# Altium footprint library Package_QFP.PcbLib: 84 footprints (part 1 of 6) (continued)
## EQFP-144-1EP_20x20mm_P0.5mm_EP6.61x5.615mm_ThermalVias [mm] (continued)
  round 0.5 hole 0.2: 145(-2.6,-2.1) 145(-2.6,-0.7) 145(-2.6,0.7) 145(-2.6,2.1) 145(-1.3,-2.1) 145(-1.3,-0.7) 145(-1.3,0.7) 145(-1.3,2.1) 145(0,-2.1) 145(0,-0.7) 145(0,0.7) 145(0,2.1) 145(1.3,-2.1) 145(1.3,-0.7) 145(1.3,0.7) 145(1.3,2.1) 145(2.6,-2.1) 145(2.6,-0.7) 145(2.6,0.7) 145(2.6,2.1)
  rect 6.61x5.615 smd: 145(0,0)
  rect 5.7x4.7 smd far side: 145(0,0)
  rrect25% 0.568x1.129 on Top Paste: Un1(-2.953,1.4) Un10(2.953,1.4) Un13(2.953,0) Un18(-2.953,0) Un22(-2.953,-1.4) Un24(2.953,-1.4)
  rrect24% 1.048x1.129 on Top Paste: Un2(-0.65,0) Un3(-0.65,-1.4) Un5(1.95,-1.4) Un6(1.95,1.4) Un9(-0.65,1.4) Un11(0.65,0) Un14(-1.95,1.4) Un15(-1.95,0) Un16(1.95,0) Un17(0.65,-1.4) Un29(0.65,1.4) Un30(-1.95,-1.4)
  round 0.508 on Top Paste: Un4(-1.95,2.454) Un12(-0.65,2.454) Un19(-1.95,-2.454) Un20(1.95,-2.454) Un21(0.65,-2.454) Un23(0.65,2.454) Un25(1.95,2.454) Un26(-0.65,-2.454)
  round 0.465 on Top Paste: Un7(2.953,-2.454) Un8(-2.953,2.454) Un27(2.953,2.454) Un28(-2.953,-2.454)
F.SilkS:
  lines w0.12: -11.4,9.16 -10.11,9.16 -10.11,10.11 -9.16,10.11 ; -10.11,-9.16 -10.11,-10.11 -9.16,-10.11 ; 9.16,-10.11 10.11,-10.11 10.11,-9.16 ; 9.16,10.11 10.11,10.11 10.11,9.16
F.Paste:
  region: -2.772,-2.357 -2.772,-2.636 -3.133,-2.636 -3.133,-2.272 -2.857,-2.272
  region: 3.133,2.272 2.857,2.272 2.772,2.357 2.772,2.636 3.133,2.636
  region: -0.188,-2.283 -0.188,-2.676 -1.112,-2.676 -1.112,-2.283 -1.06,-2.231 -0.24,-2.231
  region: 2.412,2.283 2.36,2.231 1.54,2.231 1.488,2.283 1.488,2.676 2.412,2.676
  region: 1.112,2.283 1.06,2.231 0.24,2.231 0.188,2.283 0.188,2.676 1.112,2.676
  region: 1.112,-2.283 1.112,-2.676 0.188,-2.676 0.188,-2.283 0.24,-2.231 1.06,-2.231
  region: 2.412,-2.283 2.412,-2.676 1.488,-2.676 1.488,-2.283 1.54,-2.231 2.36,-2.231
  region: -1.488,-2.283 -1.488,-2.676 -2.412,-2.676 -2.412,-2.283 -2.36,-2.231 -1.54,-2.231
  region: -0.188,2.283 -0.24,2.231 -1.06,2.231 -1.112,2.283 -1.112,2.676 -0.188,2.676
  region: -2.772,2.357 -2.857,2.272 -3.133,2.272 -3.133,2.636 -2.772,2.636
  region: 3.133,-2.636 2.772,-2.636 2.772,-2.357 2.857,-2.272 3.133,-2.272
  region: -1.488,2.283 -1.54,2.231 -2.36,2.231 -2.412,2.283 -2.412,2.676 -1.488,2.676
F.CrtYd:
  lines w0.05: -11.65,-9.15 -11.65,0 -11.65,9.15 -10.25,9.15 -10.25,10.25 -9.15,10.25 -9.15,11.65 0,11.65 9.15,11.65 9.15,10.25 10.25,10.25 10.25,9.15 11.65,9.15 11.65,0 11.65,-9.15 10.25,-9.15 10.25,-10.25 9.15,-10.25 9.15,-11.65 0,-11.65 -9.15,-11.65 -9.15,-10.25 -10.25,-10.25 -10.25,-9.15 -11.65,-9.15
F.Fab:
  lines w0.1: -10,-10 10,-10 10,10 -9,10 -10,9 -10,-10
  text "'.Designator'" at -4.047,-0.84 h1
3D body "TQFP-144_20x20mm_P0.5mm.step": height 1.1, standoff 0, extent -11,-11 11,11

## EQFP-144-1EP_20x20mm_P0.5mm_EP7.2x6.35mm [mm]
pads (175):
  rrect25% 1.475x0.3 smd: 1(-10.663,8.75) 2(-10.663,8.25) 3(-10.663,7.75) 4(-10.663,7.25) 5(-10.663,6.75) 6(-10.663,6.25) 7(-10.663,5.75) 8(-10.663,5.25) 9(-10.663,4.75) 10(-10.663,4.25) 11(-10.663,3.75) 12(-10.663,3.25) 13(-10.663,2.75) 14(-10.663,2.25) 15(-10.663,1.75) 16(-10.663,1.25) 17(-10.663,0.75) 18(-10.663,0.25) 19(-10.663,-0.25) 20(-10.663,-0.75) 21(-10.663,-1.25) 22(-10.663,-1.75) 23(-10.663,-2.25) 24(-10.663,-2.75) 25(-10.663,-3.25) 26(-10.663,-3.75) 27(-10.663,-4.25) 28(-10.663,-4.75) 29(-10.663,-5.25) 30(-10.663,-5.75) 31(-10.663,-6.25) 32(-10.663,-6.75) 33(-10.663,-7.25) 34(-10.663,-7.75) 35(-10.663,-8.25) 36(-10.663,-8.75) 73(10.663,-8.75) 74(10.663,-8.25) 75(10.663,-7.75) 76(10.663,-7.25) 77(10.663,-6.75) 78(10.663,-6.25) 79(10.663,-5.75) 80(10.663,-5.25) 81(10.663,-4.75) 82(10.663,-4.25) 83(10.663,-3.75) 84(10.663,-3.25) 85(10.663,-2.75) 86(10.663,-2.25) 87(10.663,-1.75) 88(10.663,-1.25) 89(10.663,-0.75) 90(10.663,-0.25) 91(10.663,0.25) 92(10.663,0.75) 93(10.663,1.25) 94(10.663,1.75) 95(10.663,2.25) 96(10.663,2.75) 97(10.663,3.25) 98(10.663,3.75) 99(10.663,4.25) 100(10.663,4.75) 101(10.663,5.25) 102(10.663,5.75) 103(10.663,6.25) 104(10.663,6.75) 105(10.663,7.25) 106(10.663,7.75) 107(10.663,8.25) 108(10.663,8.75)
  rrect25% 0.3x1.475 smd: 37(-8.75,-10.663) 38(-8.25,-10.663) 39(-7.75,-10.663) 40(-7.25,-10.663) 41(-6.75,-10.663) 42(-6.25,-10.663) 43(-5.75,-10.663) 44(-5.25,-10.663) 45(-4.75,-10.663) 46(-4.25,-10.663) 47(-3.75,-10.663) 48(-3.25,-10.663) 49(-2.75,-10.663) 50(-2.25,-10.663) 51(-1.75,-10.663) 52(-1.25,-10.663) 53(-0.75,-10.663) 54(-0.25,-10.663) 55(0.25,-10.663) 56(0.75,-10.663) 57(1.25,-10.663) 58(1.75,-10.663) 59(2.25,-10.663) 60(2.75,-10.663) 61(3.25,-10.663) 62(3.75,-10.663) 63(4.25,-10.663) 64(4.75,-10.663) 65(5.25,-10.663) 66(5.75,-10.663) 67(6.25,-10.663) 68(6.75,-10.663) 69(7.25,-10.663) 70(7.75,-10.663) 71(8.25,-10.663) 72(8.75,-10.663) 109(8.75,10.663) 110(8.25,10.663) 111(7.75,10.663) 112(7.25,10.663) 113(6.75,10.663) 114(6.25,10.663) 115(5.75,10.663) 116(5.25,10.663) 117(4.75,10.663) 118(4.25,10.663) 119(3.75,10.663) 120(3.25,10.663) 121(2.75,10.663) 122(2.25,10.663) 123(1.75,10.663) 124(1.25,10.663) 125(0.75,10.663) 126(0.25,10.663) 127(-0.25,10.663) 128(-0.75,10.663) 129(-1.25,10.663) 130(-1.75,10.663) 131(-2.25,10.663) 132(-2.75,10.663) 133(-3.25,10.663) 134(-3.75,10.663) 135(-4.25,10.663) 136(-4.75,10.663) 137(-5.25,10.663) 138(-5.75,10.663) 139(-6.25,10.663) 140(-6.75,10.663) 141(-7.25,10.663) 142(-7.75,10.663) 143(-8.25,10.663) 144(-8.75,10.663)
  rect 7.2x6.35 smd: 145(0,0)
  rrect25% 0.97x1.02 on Top Paste: Un1(-3,0) Un2(3,1.27) Un3(3,-1.27) Un4(1.8,-2.54) Un5(1.8,0) Un6(-0.6,2.54) Un7(3,-2.54) Un8(-1.8,2.54) Un9(0.6,-2.54) Un10(1.8,-1.27) Un11(-0.6,0) Un12(3,2.54) Un13(-0.6,1.27) Un14(-1.8,1.27) Un15(0.6,-1.27) Un16(-0.6,-1.27) Un17(-0.6,-2.54) Un18(3,0) Un19(-3,-1.27) Un20(0.6,1.27) Un21(-1.8,-1.27) Un22(0.6,0) Un23(0.6,2.54) Un24(-1.8,0) Un25(-1.8,-2.54) Un26(-3,-2.54) Un27(-3,1.27) Un28(1.8,2.54) Un29(-3,2.54) Un30(1.8,1.27)
F.SilkS:
  lines w0.12: -11.4,9.16 -10.11,9.16 -10.11,10.11 -9.16,10.11 ; -10.11,-9.16 -10.11,-10.11 -9.16,-10.11 ; 9.16,-10.11 10.11,-10.11 10.11,-9.16 ; 9.16,10.11 10.11,10.11 10.11,9.16
F.CrtYd:
  lines w0.05: -11.65,-9.15 -11.65,0 -11.65,9.15 -10.25,9.15 -10.25,10.25 -9.15,10.25 -9.15,11.65 0,11.65 9.15,11.65 9.15,10.25 10.25,10.25 10.25,9.15 11.65,9.15 11.65,0 11.65,-9.15 10.25,-9.15 10.25,-10.25 9.15,-10.25 9.15,-11.65 0,-11.65 -9.15,-11.65 -9.15,-10.25 -10.25,-10.25 -10.25,-9.15 -11.65,-9.15
F.Fab:
  lines w0.1: -10,-10 -10,9 -9,10 10,10 10,-10 -10,-10
  text "'.Designator'" at -4.047,-0.84 h1
3D body "TQFP-144_20x20mm_P0.5mm.step": height 1.1, standoff 0, extent -11,-11 11,11

## EQFP-144-1EP_20x20mm_P0.5mm_EP7.2x6.35mm_ThermalVias [mm]
pads (218):
  rrect25% 1.475x0.3 smd: 1(-10.663,8.75) 2(-10.663,8.25) 3(-10.663,7.75) 4(-10.663,7.25) 5(-10.663,6.75) 6(-10.663,6.25) 7(-10.663,5.75) 8(-10.663,5.25) 9(-10.663,4.75) 10(-10.663,4.25) 11(-10.663,3.75) 12(-10.663,3.25) 13(-10.663,2.75) 14(-10.663,2.25) 15(-10.663,1.75) 16(-10.663,1.25) 17(-10.663,0.75) 18(-10.663,0.25) 19(-10.663,-0.25) 20(-10.663,-0.75) 21(-10.663,-1.25) 22(-10.663,-1.75) 23(-10.663,-2.25) 24(-10.663,-2.75) 25(-10.663,-3.25) 26(-10.663,-3.75) 27(-10.663,-4.25) 28(-10.663,-4.75) 29(-10.663,-5.25) 30(-10.663,-5.75) 31(-10.663,-6.25) 32(-10.663,-6.75) 33(-10.663,-7.25) 34(-10.663,-7.75) 35(-10.663,-8.25) 36(-10.663,-8.75) 73(10.663,-8.75) 74(10.663,-8.25) 75(10.663,-7.75) 76(10.663,-7.25) 77(10.663,-6.75) 78(10.663,-6.25) 79(10.663,-5.75) 80(10.663,-5.25) 81(10.663,-4.75) 82(10.663,-4.25) 83(10.663,-3.75) 84(10.663,-3.25) 85(10.663,-2.75) 86(10.663,-2.25) 87(10.663,-1.75) 88(10.663,-1.25) 89(10.663,-0.75) 90(10.663,-0.25) 91(10.663,0.25) 92(10.663,0.75) 93(10.663,1.25) 94(10.663,1.75) 95(10.663,2.25) 96(10.663,2.75) 97(10.663,3.25) 98(10.663,3.75) 99(10.663,4.25) 100(10.663,4.75) 101(10.663,5.25) 102(10.663,5.75) 103(10.663,6.25) 104(10.663,6.75) 105(10.663,7.25) 106(10.663,7.75) 107(10.663,8.25) 108(10.663,8.75)
  rrect25% 0.3x1.475 smd: 37(-8.75,-10.663) 38(-8.25,-10.663) 39(-7.75,-10.663) 40(-7.25,-10.663) 41(-6.75,-10.663) 42(-6.25,-10.663) 43(-5.75,-10.663) 44(-5.25,-10.663) 45(-4.75,-10.663) 46(-4.25,-10.663) 47(-3.75,-10.663) 48(-3.25,-10.663) 49(-2.75,-10.663) 50(-2.25,-10.663) 51(-1.75,-10.663) 52(-1.25,-10.663) 53(-0.75,-10.663) 54(-0.25,-10.663) 55(0.25,-10.663) 56(0.75,-10.663) 57(1.25,-10.663) 58(1.75,-10.663) 59(2.25,-10.663) 60(2.75,-10.663) 61(3.25,-10.663) 62(3.75,-10.663) 63(4.25,-10.663) 64(4.75,-10.663) 65(5.25,-10.663) 66(5.75,-10.663) 67(6.25,-10.663) 68(6.75,-10.663) 69(7.25,-10.663) 70(7.75,-10.663) 71(8.25,-10.663) 72(8.75,-10.663) 109(8.75,10.663) 110(8.25,10.663) 111(7.75,10.663) 112(7.25,10.663) 113(6.75,10.663) 114(6.25,10.663) 115(5.75,10.663) 116(5.25,10.663) 117(4.75,10.663) 118(4.25,10.663) 119(3.75,10.663) 120(3.25,10.663) 121(2.75,10.663) 122(2.25,10.663) 123(1.75,10.663) 124(1.25,10.663) 125(0.75,10.663) 126(0.25,10.663) 127(-0.25,10.663) 128(-0.75,10.663) 129(-1.25,10.663) 130(-1.75,10.663) 131(-2.25,10.663) 132(-2.75,10.663) 133(-3.25,10.663) 134(-3.75,10.663) 135(-4.25,10.663) 136(-4.75,10.663) 137(-5.25,10.663) 138(-5.75,10.663) 139(-6.25,10.663) 140(-6.75,10.663) 141(-7.25,10.663) 142(-7.75,10.663) 143(-8.25,10.663) 144(-8.75,10.663)
  round 0.5 hole 0.2: 145(-3,-2.4) 145(-3,-1.2) 145(-3,0) 145(-3,1.2) 145(-3,2.4) 145(-1.8,-2.4) 145(-1.8,-1.2) 145(-1.8,0) 145(-1.8,1.2) 145(-1.8,2.4) 145(-0.6,-2.4) 145(-0.6,-1.2) 145(-0.6,0) 145(-0.6,1.2) 145(-0.6,2.4) 145(0.6,-2.4) 145(0.6,-1.2) 145(0.6,0) 145(0.6,1.2) 145(0.6,2.4) 145(1.8,-2.4) 145(1.8,-1.2) 145(1.8,0) 145(1.8,1.2) 145(1.8,2.4) 145(3,-2.4) 145(3,-1.2) 145(3,0) 145(3,1.2) 145(3,2.4)
  rect 7.2x6.35 smd: 145(0,0)
  rect 6.5x5.3 smd far side: 145(0,0)
  rrect25% 0.967x0.625 on Top Paste: Un1(-2.4,2.788) Un4(2.4,2.788) Un10(-2.4,-2.788) Un14(2.4,-2.788) Un16(0,2.788) Un18(-1.2,-2.788) Un20(1.2,-2.788) Un28(0,-2.788) Un39(1.2,2.788) Un40(-1.2,2.788)
  round 0.378 on Top Paste: Un2(-3.3,-2.788) Un23(-3.3,2.788) Un24(3.3,-2.788) Un41(3.3,2.788)
  rrect25% 0.967x0.967 on Top Paste: Un3(-2.4,1.8) Un5(-1.2,0.6) Un6(2.4,0.6) Un7(1.2,-0.6) Un8(-1.2,-0.6) Un11(2.4,-1.8) Un12(-1.2,-1.8) Un15(-2.4,-0.6) Un17(2.4,-0.6) Un21(0,-1.8) Un25(1.2,0.6) Un26(1.2,-1.8) Un27(-1.2,1.8) Un30(1.2,1.8) Un31(-2.4,-1.8) Un32(0,1.8) Un33(0,-0.6) Un35(0,0.6) Un36(2.4,1.8) Un42(-2.4,0.6)
  round 0.407 on Top Paste: Un9(-3.3,-0.6) Un13(-3.3,0.6) Un19(-3.3,1.8) Un22(3.3,1.8) Un29(3.3,0.6) Un34(3.3,-0.6) Un37(-3.3,-1.8) Un38(3.3,-1.8)
F.SilkS:
  lines w0.12: -11.4,9.16 -10.11,9.16 -10.11,10.11 -9.16,10.11 ; -10.11,-9.16 -10.11,-10.11 -9.16,-10.11 ; 9.16,-10.11 10.11,-10.11 10.11,-9.16 ; 9.16,10.11 10.11,10.11 10.11,9.16
F.Paste:
  region: -3.164,-2.669 -3.164,-2.994 -3.436,-2.994 -3.436,-2.581 -3.252,-2.581
  region: -3.135,-0.256 -3.135,-0.944 -3.198,-1.007 -3.465,-1.007 -3.465,-0.193 -3.198,-0.193
  region: -3.135,0.944 -3.135,0.256 -3.198,0.193 -3.465,0.193 -3.465,1.007 -3.198,1.007
  region: -3.135,2.144 -3.135,1.456 -3.198,1.393 -3.465,1.393 -3.465,2.207 -3.198,2.207
  region: 3.465,1.393 3.198,1.393 3.135,1.456 3.135,2.144 3.198,2.207 3.465,2.207
  region: -3.164,2.669 -3.252,2.581 -3.436,2.581 -3.436,2.994 -3.164,2.994
  region: 3.436,-2.994 3.164,-2.994 3.164,-2.669 3.252,-2.581 3.436,-2.581
  region: 3.465,0.193 3.198,0.193 3.135,0.256 3.135,0.944 3.198,1.007 3.465,1.007
  region: 3.465,-1.007 3.198,-1.007 3.135,-0.944 3.135,-0.256 3.198,-0.193 3.465,-0.193
  region: -3.135,-1.456 -3.135,-2.144 -3.198,-2.207 -3.465,-2.207 -3.465,-1.393 -3.198,-1.393
  region: 3.465,-2.207 3.198,-2.207 3.135,-2.144 3.135,-1.456 3.198,-1.393 3.465,-1.393
  region: 3.436,2.581 3.252,2.581 3.164,2.669 3.164,2.994 3.436,2.994
F.CrtYd:
  lines w0.05: -11.65,-9.15 -10.25,-9.15 -10.25,-10.25 -9.15,-10.25 -9.15,-11.65 0,-11.65 9.15,-11.65 9.15,-10.25 10.25,-10.25 10.25,-9.15 11.65,-9.15 11.65,0 11.65,9.15 10.25,9.15 10.25,10.25 9.15,10.25 9.15,11.65 0,11.65 -9.15,11.65 -9.15,10.25 -10.25,10.25 -10.25,9.15 -11.65,9.15 -11.65,0 -11.65,-9.15
F.Fab:
  lines w0.1: -10,-10 -10,9 -9,10 10,10 10,-10 -10,-10
  text "'.Designator'" at -4.047,-0.84 h1
3D body "TQFP-144_20x20mm_P0.5mm.step": height 1.1, standoff 0, extent -11,-11 11,11

## EQFP-144-1EP_20x20mm_P0.5mm_EP8.93x8.7mm [mm]
pads (194):
  rrect25% 1.475x0.3 smd: 1(-10.663,8.75) 2(-10.663,8.25) 3(-10.663,7.75) 4(-10.663,7.25) 5(-10.663,6.75) 6(-10.663,6.25) 7(-10.663,5.75) 8(-10.663,5.25) 9(-10.663,4.75) 10(-10.663,4.25) 11(-10.663,3.75) 12(-10.663,3.25) 13(-10.663,2.75) 14(-10.663,2.25) 15(-10.663,1.75) 16(-10.663,1.25) 17(-10.663,0.75) 18(-10.663,0.25) 19(-10.663,-0.25) 20(-10.663,-0.75) 21(-10.663,-1.25) 22(-10.663,-1.75) 23(-10.663,-2.25) 24(-10.663,-2.75) 25(-10.663,-3.25) 26(-10.663,-3.75) 27(-10.663,-4.25) 28(-10.663,-4.75) 29(-10.663,-5.25) 30(-10.663,-5.75) 31(-10.663,-6.25) 32(-10.663,-6.75) 33(-10.663,-7.25) 34(-10.663,-7.75) 35(-10.663,-8.25) 36(-10.663,-8.75) 73(10.663,-8.75) 74(10.663,-8.25) 75(10.663,-7.75) 76(10.663,-7.25) 77(10.663,-6.75) 78(10.663,-6.25) 79(10.663,-5.75) 80(10.663,-5.25) 81(10.663,-4.75) 82(10.663,-4.25) 83(10.663,-3.75) 84(10.663,-3.25) 85(10.663,-2.75) 86(10.663,-2.25) 87(10.663,-1.75) 88(10.663,-1.25) 89(10.663,-0.75) 90(10.663,-0.25) 91(10.663,0.25) 92(10.663,0.75) 93(10.663,1.25) 94(10.663,1.75) 95(10.663,2.25) 96(10.663,2.75) 97(10.663,3.25) 98(10.663,3.75) 99(10.663,4.25) 100(10.663,4.75) 101(10.663,5.25) 102(10.663,5.75) 103(10.663,6.25) 104(10.663,6.75) 105(10.663,7.25) 106(10.663,7.75) 107(10.663,8.25) 108(10.663,8.75)
  rrect25% 0.3x1.475 smd: 37(-8.75,-10.663) 38(-8.25,-10.663) 39(-7.75,-10.663) 40(-7.25,-10.663) 41(-6.75,-10.663) 42(-6.25,-10.663) 43(-5.75,-10.663) 44(-5.25,-10.663) 45(-4.75,-10.663) 46(-4.25,-10.663) 47(-3.75,-10.663) 48(-3.25,-10.663) 49(-2.75,-10.663) 50(-2.25,-10.663) 51(-1.75,-10.663) 52(-1.25,-10.663) 53(-0.75,-10.663) 54(-0.25,-10.663) 55(0.25,-10.663) 56(0.75,-10.663) 57(1.25,-10.663) 58(1.75,-10.663) 59(2.25,-10.663) 60(2.75,-10.663) 61(3.25,-10.663) 62(3.75,-10.663) 63(4.25,-10.663) 64(4.75,-10.663) 65(5.25,-10.663) 66(5.75,-10.663) 67(6.25,-10.663) 68(6.75,-10.663) 69(7.25,-10.663) 70(7.75,-10.663) 71(8.25,-10.663) 72(8.75,-10.663) 109(8.75,10.663) 110(8.25,10.663) 111(7.75,10.663) 112(7.25,10.663) 113(6.75,10.663) 114(6.25,10.663) 115(5.75,10.663) 116(5.25,10.663) 117(4.75,10.663) 118(4.25,10.663) 119(3.75,10.663) 120(3.25,10.663) 121(2.75,10.663) 122(2.25,10.663) 123(1.75,10.663) 124(1.25,10.663) 125(0.75,10.663) 126(0.25,10.663) 127(-0.25,10.663) 128(-0.75,10.663) 129(-1.25,10.663) 130(-1.75,10.663) 131(-2.25,10.663) 132(-2.75,10.663) 133(-3.25,10.663) 134(-3.75,10.663) 135(-4.25,10.663) 136(-4.75,10.663) 137(-5.25,10.663) 138(-5.75,10.663) 139(-6.25,10.663) 140(-6.75,10.663) 141(-7.25,10.663) 142(-7.75,10.663) 143(-8.25,10.663) 144(-8.75,10.663)
  rect 8.93x8.7 smd: 145(0,0)
  rrect25% 1.03x1 on Top Paste: Un1(1.28,2.48) Un2(-2.56,-2.48) Un3(1.28,1.24) Un4(0,2.48) Un5(-3.84,-1.24) Un6(-1.28,2.48) Un7(3.84,0) Un8(-2.56,-3.72) Un9(-3.84,-2.48) Un10(3.84,-1.24) Un11(-1.28,-2.48) Un12(0,0) Un13(-2.56,-1.24) Un14(-1.28,1.24) Un15(2.56,-1.24) Un16(-1.28,-1.24) Un17(0,-2.48) Un18(1.28,-2.48) Un19(2.56,0) Un20(2.56,2.48) Un21(-2.56,0) Un22(2.56,-3.72) Un23(1.28,-3.72) Un24(-2.56,1.24) Un25(-3.84,1.24) Un26(0,3.72) Un27(0,-1.24) Un28(-1.28,0) Un29(3.84,-3.72) Un30(3.84,2.48) Un31(-1.28,-3.72) Un32(-3.84,0) Un33(1.28,-1.24) Un34(-3.84,2.48) Un35(-1.28,3.72) Un36(1.28,3.72) Un37(-2.56,3.72) Un38(0,-3.72) Un39(3.84,1.24) Un40(2.56,1.24) Un41(-2.56,2.48) Un42(0,1.24) Un43(-3.84,-3.72) Un44(3.84,3.72) Un45(3.84,-2.48) Un46(-3.84,3.72) Un47(1.28,0) Un48(2.56,3.72) Un49(2.56,-2.48)
F.SilkS:
  lines w0.12: -11.4,9.16 -10.11,9.16 -10.11,10.11 -9.16,10.11 ; -10.11,-9.16 -10.11,-10.11 -9.16,-10.11 ; 9.16,-10.11 10.11,-10.11 10.11,-9.16 ; 9.16,10.11 10.11,10.11 10.11,9.16
F.CrtYd:
  lines w0.05: -11.65,-9.15 -10.25,-9.15 -10.25,-10.25 -9.15,-10.25 -9.15,-11.65 0,-11.65 9.15,-11.65 9.15,-10.25 10.25,-10.25 10.25,-9.15 11.65,-9.15 11.65,0 11.65,9.15 10.25,9.15 10.25,10.25 9.15,10.25 9.15,11.65 0,11.65 -9.15,11.65 -9.15,10.25 -10.25,10.25 -10.25,9.15 -11.65,9.15 -11.65,0 -11.65,-9.15
F.Fab:
  lines w0.1: -10,-10 -10,9 -9,10 10,10 10,-10 -10,-10
  text "'.Designator'" at -4.047,-0.84 h1
3D body "TQFP-144_20x20mm_P0.5mm.step": height 1.1, standoff 0, extent -11,-11 11,11

## EQFP-144-1EP_20x20mm_P0.5mm_EP8.93x8.7mm_ThermalVias [mm]
pads (259):
  rrect25% 1.475x0.3 smd: 1(-10.663,8.75) 2(-10.663,8.25) 3(-10.663,7.75) 4(-10.663,7.25) 5(-10.663,6.75) 6(-10.663,6.25) 7(-10.663,5.75) 8(-10.663,5.25) 9(-10.663,4.75) 10(-10.663,4.25) 11(-10.663,3.75) 12(-10.663,3.25) 13(-10.663,2.75) 14(-10.663,2.25) 15(-10.663,1.75) 16(-10.663,1.25) 17(-10.663,0.75) 18(-10.663,0.25) 19(-10.663,-0.25) 20(-10.663,-0.75) 21(-10.663,-1.25) 22(-10.663,-1.75) 23(-10.663,-2.25) 24(-10.663,-2.75) 25(-10.663,-3.25) 26(-10.663,-3.75) 27(-10.663,-4.25) 28(-10.663,-4.75) 29(-10.663,-5.25) 30(-10.663,-5.75) 31(-10.663,-6.25) 32(-10.663,-6.75) 33(-10.663,-7.25) 34(-10.663,-7.75) 35(-10.663,-8.25) 36(-10.663,-8.75) 73(10.663,-8.75) 74(10.663,-8.25) 75(10.663,-7.75) 76(10.663,-7.25) 77(10.663,-6.75) 78(10.663,-6.25) 79(10.663,-5.75) 80(10.663,-5.25) 81(10.663,-4.75) 82(10.663,-4.25) 83(10.663,-3.75) 84(10.663,-3.25) 85(10.663,-2.75) 86(10.663,-2.25) 87(10.663,-1.75) 88(10.663,-1.25) 89(10.663,-0.75) 90(10.663,-0.25) 91(10.663,0.25) 92(10.663,0.75) 93(10.663,1.25) 94(10.663,1.75) 95(10.663,2.25) 96(10.663,2.75) 97(10.663,3.25) 98(10.663,3.75) 99(10.663,4.25) 100(10.663,4.75) 101(10.663,5.25) 102(10.663,5.75) 103(10.663,6.25) 104(10.663,6.75) 105(10.663,7.25) 106(10.663,7.75) 107(10.663,8.25) 108(10.663,8.75)
  rrect25% 0.3x1.475 smd: 37(-8.75,-10.663) 38(-8.25,-10.663) 39(-7.75,-10.663) 40(-7.25,-10.663) 41(-6.75,-10.663) 42(-6.25,-10.663) 43(-5.75,-10.663) 44(-5.25,-10.663) 45(-4.75,-10.663) 46(-4.25,-10.663) 47(-3.75,-10.663) 48(-3.25,-10.663) 49(-2.75,-10.663) 50(-2.25,-10.663) 51(-1.75,-10.663) 52(-1.25,-10.663) 53(-0.75,-10.663) 54(-0.25,-10.663) 55(0.25,-10.663) 56(0.75,-10.663) 57(1.25,-10.663) 58(1.75,-10.663) 59(2.25,-10.663) 60(2.75,-10.663) 61(3.25,-10.663) 62(3.75,-10.663) 63(4.25,-10.663) 64(4.75,-10.663) 65(5.25,-10.663) 66(5.75,-10.663) 67(6.25,-10.663) 68(6.75,-10.663) 69(7.25,-10.663) 70(7.75,-10.663) 71(8.25,-10.663) 72(8.75,-10.663) 109(8.75,10.663) 110(8.25,10.663) 111(7.75,10.663) 112(7.25,10.663) 113(6.75,10.663) 114(6.25,10.663) 115(5.75,10.663) 116(5.25,10.663) 117(4.75,10.663) 118(4.25,10.663) 119(3.75,10.663) 120(3.25,10.663) 121(2.75,10.663) 122(2.25,10.663) 123(1.75,10.663) 124(1.25,10.663) 125(0.75,10.663) 126(0.25,10.663) 127(-0.25,10.663) 128(-0.75,10.663) 129(-1.25,10.663) 130(-1.75,10.663) 131(-2.25,10.663) 132(-2.75,10.663) 133(-3.25,10.663) 134(-3.75,10.663) 135(-4.25,10.663) 136(-4.75,10.663) 137(-5.25,10.663) 138(-5.75,10.663) 139(-6.25,10.663) 140(-6.75,10.663) 141(-7.25,10.663) 142(-7.75,10.663) 143(-8.25,10.663) 144(-8.75,10.663)
  round 0.5 hole 0.2: 145(-3.6,-3.6) 145(-3.6,-2.4) 145(-3.6,-1.2) 145(-3.6,0) 145(-3.6,1.2) 145(-3.6,2.4) 145(-3.6,3.6) 145(-2.4,-3.6) 145(-2.4,-2.4) 145(-2.4,-1.2) 145(-2.4,0) 145(-2.4,1.2) 145(-2.4,2.4) 145(-2.4,3.6) 145(-1.2,-3.6) 145(-1.2,-2.4) 145(-1.2,-1.2) 145(-1.2,0) 145(-1.2,1.2) 145(-1.2,2.4) 145(-1.2,3.6) 145(0,-3.6) 145(0,-2.4) 145(0,-1.2) 145(0,0) 145(0,1.2) 145(0,2.4) 145(0,3.6) 145(1.2,-3.6) 145(1.2,-2.4) 145(1.2,-1.2) 145(1.2,0) 145(1.2,1.2) 145(1.2,2.4) 145(1.2,3.6) 145(2.4,-3.6) 145(2.4,-2.4) 145(2.4,-1.2) 145(2.4,0) 145(2.4,1.2) 145(2.4,2.4) 145(2.4,3.6) 145(3.6,-3.6) 145(3.6,-2.4) 145(3.6,-1.2) 145(3.6,0) 145(3.6,1.2) 145(3.6,2.4) 145(3.6,3.6)
  rect 8.93x8.7 smd: 145(0,0)
  rect 7.7x7.7 smd far side: 145(0,0)
  rrect25% 0.967x0.967 on Top Paste: Un1(-0.6,-3) Un2(-3,0.6) Un3(-3,-0.6) Un6(0.6,3) Un7(1.8,0.6) Un9(-0.6,0.6) Un13(3,1.8) Un15(3,-0.6) Un16(-3,-3) Un17(0.6,-3) Un18(0.6,-1.8) Un19(3,-1.8) Un22(1.8,-0.6) Un23(-0.6,-0.6) Un26(3,0.6) Un27(-0.6,3) Un28(-3,-1.8) Un29(-0.6,1.8) Un30(3,-3) Un32(1.8,3) Un33(-1.8,-0.6) Un35(-1.8,-3) Un39(0.6,0.6) Un40(-1.8,0.6) Un42(-3,3) Un43(1.8,-1.8) Un44(3,3) Un48(-1.8,1.8) Un51(-1.8,3) Un52(-1.8,-1.8) Un53(-0.6,-1.8) Un58(0.6,1.8) Un59(1.8,-3) Un61(1.8,1.8) Un63(-3,1.8) Un64(0.6,-0.6)
  round 0.538 on Top Paste: Un4(-3,3.975) Un8(1.8,-3.975) Un11(-1.8,3.975) Un14(3,3.975) Un21(-0.6,-3.975) Un31(1.8,3.975) Un36(0.6,3.975) Un37(3,-3.975) Un45(-1.8,-3.975) Un49(-0.6,3.975) Un56(-3,-3.975) Un57(0.6,-3.975)
  round 0.515 on Top Paste: Un5(-4.032,-3.975) Un24(4.032,-3.975) Un46(-4.032,3.975) Un62(4.032,3.975)
  rrect25% 0.697x0.967 on Top Paste: Un10(-4.032,-1.8) Un12(-4.032,0.6) Un20(-4.032,-0.6) Un25(4.032,1.8) Un34(4.032,-0.6) Un38(4.032,-3) Un41(-4.032,-3) Un47(-4.032,3) Un50(-4.032,1.8) Un54(4.032,-1.8) Un55(4.032,0.6) Un60(4.032,3)
F.SilkS:
  lines w0.12: -11.4,9.16 -10.11,9.16 -10.11,10.11 -9.16,10.11 ; -10.11,-9.16 -10.11,-10.11 -9.16,-10.11 ; 9.16,-10.11 10.11,-10.11 10.11,-9.16 ; 9.16,10.11 10.11,10.11 10.11,9.16
F.Paste:
  region: -2.583,3.794 -2.638,3.739 -3.362,3.739 -3.417,3.794 -3.417,4.211 -2.583,4.211
  region: -3.773,-3.836 -3.773,-4.188 -4.292,-4.188 -4.292,-3.762 -3.847,-3.762
  region: 2.217,-3.794 2.217,-4.211 1.383,-4.211 1.383,-3.794 1.438,-3.739 2.162,-3.739
  region: -1.383,3.794 -1.438,3.739 -2.162,3.739 -2.217,3.794 -2.217,4.211 -1.383,4.211
  region: 3.417,3.794 3.362,3.739 2.638,3.739 2.583,3.794 2.583,4.211 3.417,4.211
  region: -0.183,-3.794 -0.183,-4.211 -1.017,-4.211 -1.017,-3.794 -0.962,-3.739 -0.238,-3.739
  region: 4.292,-4.188 3.773,-4.188 3.773,-3.836 3.847,-3.762 4.292,-3.762
  region: 2.217,3.794 2.162,3.739 1.438,3.739 1.383,3.794 1.383,4.211 2.217,4.211
  region: 1.017,3.794 0.962,3.739 0.238,3.739 0.183,3.794 0.183,4.211 1.017,4.211
  region: 3.417,-3.794 3.417,-4.211 2.583,-4.211 2.583,-3.794 2.638,-3.739 3.362,-3.739
  region: -1.383,-3.794 -1.383,-4.211 -2.217,-4.211 -2.217,-3.794 -2.162,-3.739 -1.438,-3.739
  region: -3.773,3.836 -3.847,3.762 -4.292,3.762 -4.292,4.188 -3.773,4.188
  region: -0.183,3.794 -0.238,3.739 -0.962,3.739 -1.017,3.794 -1.017,4.211 -0.183,4.211
  region: -2.583,-3.794 -2.583,-4.211 -3.417,-4.211 -3.417,-3.794 -3.362,-3.739 -2.638,-3.739
  region: 1.017,-3.794 1.017,-4.211 0.183,-4.211 0.183,-3.794 0.238,-3.739 0.962,-3.739
  region: 4.292,3.762 3.847,3.762 3.773,3.836 3.773,4.188 4.292,4.188
F.CrtYd:
  lines w0.05: -11.65,-9.15 -10.25,-9.15 -10.25,-10.25 -9.15,-10.25 -9.15,-11.65 0,-11.65 9.15,-11.65 9.15,-10.25 10.25,-10.25 10.25,-9.15 11.65,-9.15 11.65,0 11.65,9.15 10.25,9.15 10.25,10.25 9.15,10.25 9.15,11.65 0,11.65 -9.15,11.65 -9.15,10.25 -10.25,10.25 -10.25,9.15 -11.65,9.15 -11.65,0 -11.65,-9.15
F.Fab:
  lines w0.1: -10,-10 10,-10 10,10 -9,10 -10,9 -10,-10
  text "'.Designator'" at -4.047,-0.84 h1
3D body "TQFP-144_20x20mm_P0.5mm.step": height 1.1, standoff 0, extent -11,-11 11,11

## HTQFP-64-1EP_10x10mm_P0.5mm_EP8x8mm [mm]
pads (69):
  rect 1.5x0.3 smd: 1(-5.7,3.75) 2(-5.7,3.25) 3(-5.7,2.75) 4(-5.7,2.25) 5(-5.7,1.75) 6(-5.7,1.25) 7(-5.7,0.75) 8(-5.7,0.25) 9(-5.7,-0.25) 10(-5.7,-0.75) 11(-5.7,-1.25) 12(-5.7,-1.75) 13(-5.7,-2.25) 14(-5.7,-2.75) 15(-5.7,-3.25) 16(-5.7,-3.75) 33(5.7,-3.75) 34(5.7,-3.25) 35(5.7,-2.75) 36(5.7,-2.25) 37(5.7,-1.75) 38(5.7,-1.25) 39(5.7,-0.75) 40(5.7,-0.25) 41(5.7,0.25) 42(5.7,0.75) 43(5.7,1.25) 44(5.7,1.75) 45(5.7,2.25) 46(5.7,2.75) 47(5.7,3.25) 48(5.7,3.75)
  rect 0.3x1.5 smd: 17(-3.75,-5.7) 18(-3.25,-5.7) 19(-2.75,-5.7) 20(-2.25,-5.7) 21(-1.75,-5.7) 22(-1.25,-5.7) 23(-0.75,-5.7) 24(-0.25,-5.7) 25(0.25,-5.7) 26(0.75,-5.7) 27(1.25,-5.7) 28(1.75,-5.7) 29(2.25,-5.7) 30(2.75,-5.7) 31(3.25,-5.7) 32(3.75,-5.7) 49(3.75,5.7) 50(3.25,5.7) 51(2.75,5.7) 52(2.25,5.7) 53(1.75,5.7) 54(1.25,5.7) 55(0.75,5.7) 56(0.25,5.7) 57(-0.25,5.7) 58(-0.75,5.7) 59(-1.25,5.7) 60(-1.75,5.7) 61(-2.25,5.7) 62(-2.75,5.7) 63(-3.25,5.7) 64(-3.75,5.7)
  rect 8x8 smd: 65(0,0)
  rect 3.2x3.2 on Top Paste: Un1(-2,-2) Un2(-2,2) Un3(2,2) Un4(2,-2)
F.SilkS:
  lines w0.12: -6.45,4.225 -5.175,4.225 -5.175,5.175 -4.125,5.175 ; -5.175,-4.125 -5.175,-5.175 -4.125,-5.175 ; 4.125,-5.175 5.175,-5.175 5.175,-4.125 ; 4.125,5.175 5.175,5.175 5.175,4.125
F.CrtYd:
  lines w0.05: -6.7,-6.7 6.7,-6.7 6.7,6.7 -6.7,6.7 -6.7,-6.7
F.Fab:
  lines w0.1: -5,-5 -5,4 -4,5 5,5 5,-5 -5,-5
  text "'.Designator'" at -4.047,-0.84 h1
3D body "TQFP-64-1EP_10x10mm_P0.5mm_EP8x8mm.step": height 1.1, standoff 0, extent -6,-6 6,6